# Altium footprint library STM32F103_Warship.PcbLib: 55 footprints (part 3 of 4)
Each footprint in its own frame and in the unit in brackets; x right, y up, seen from the top. Pads: shape width x height; smd on the part's side, far side on the other; paste and mask are expansions set on the pad; w line width, h text height; cw(c..) or ccw(c..) is an arc to the next point about the centre after c.
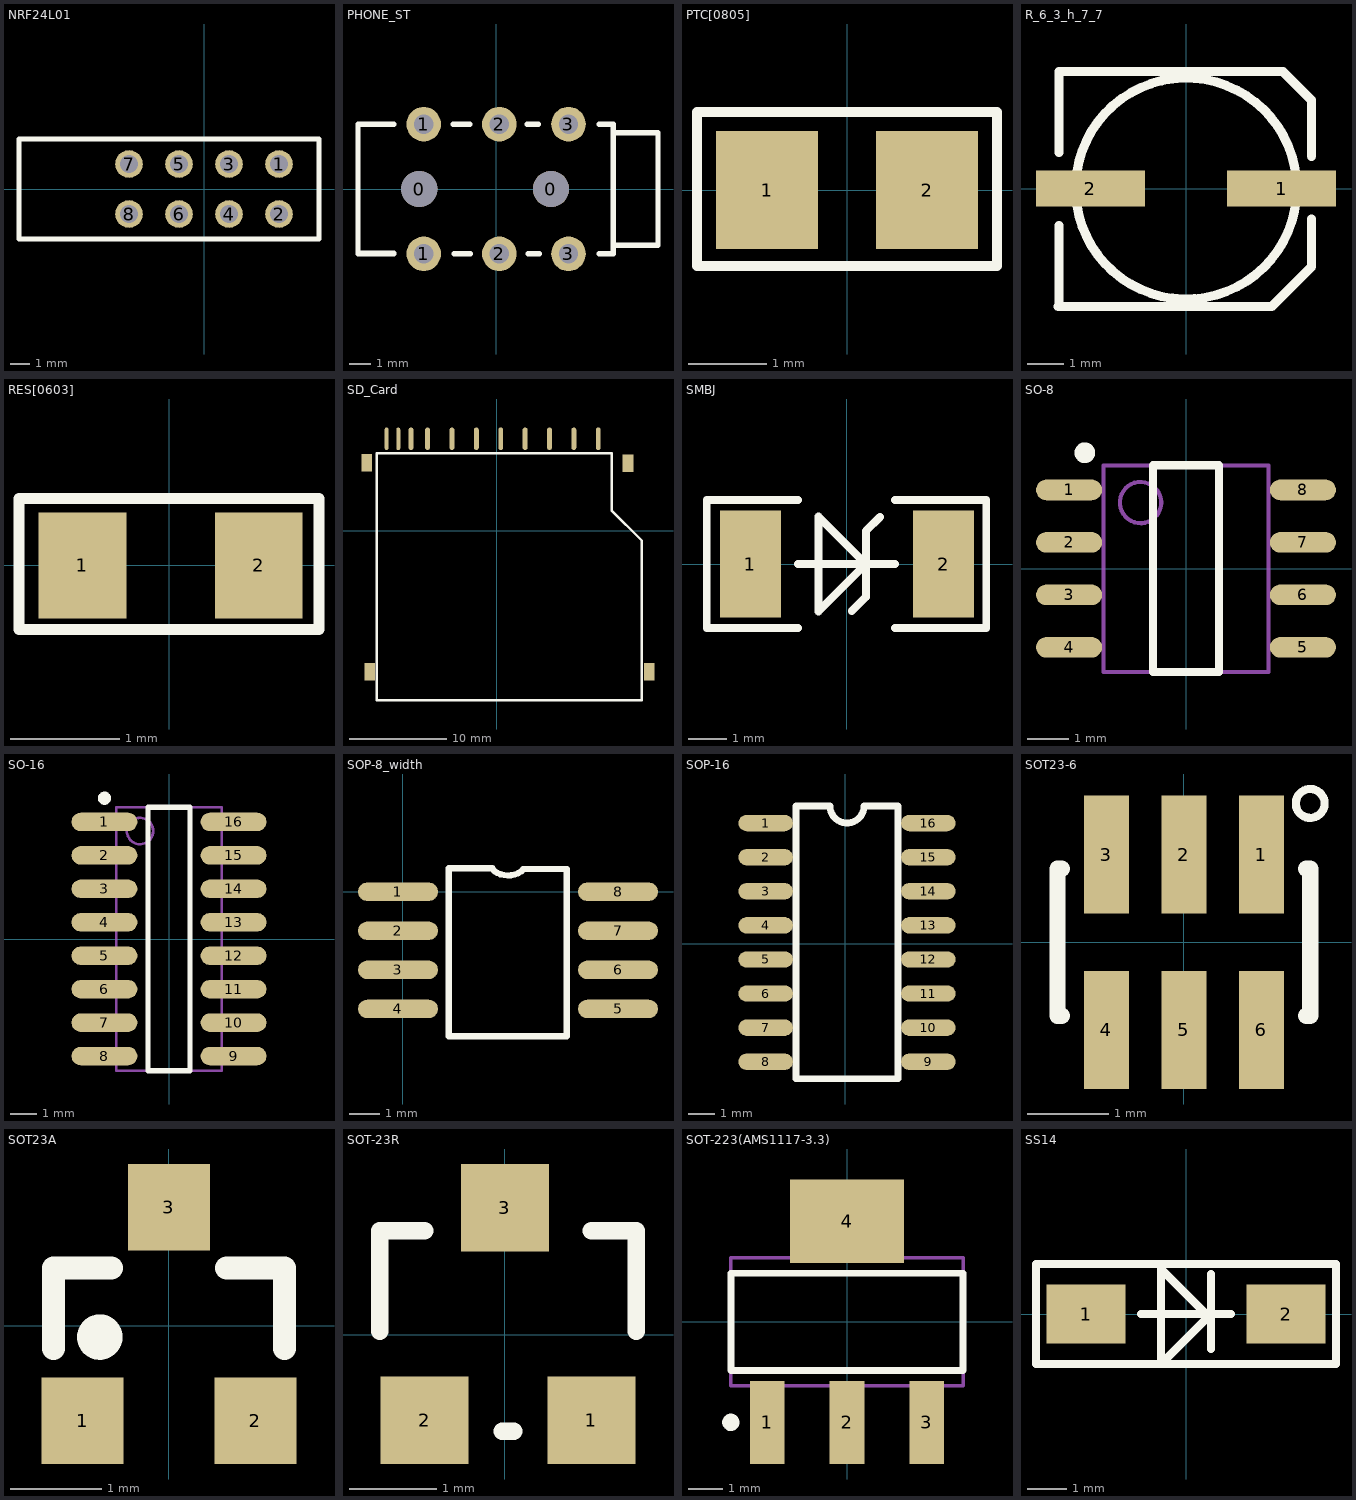
[diagram p2: the footprints below, top view; thin cyan lines are the x and y axes]

## NRF24L01 [mm]
pads (8):
  round 1.4 hole 0.9: 1(3.81,1.27) 2(3.81,-1.27) 3(1.27,1.27) 4(1.27,-1.27) 5(-1.27,1.27) 6(-1.27,-1.27) 7(-3.81,1.27) 8(-3.81,-1.27)
Top Overlay:
  lines w0.254: -9.398,-2.54 5.842,-2.54 5.842,2.54 -9.398,2.54 -9.398,-2.54
3D body "User Library-MY-NRF24L01P.STEP": height 14.8, standoff -0.11, extent -9.209,-26.514 5.791,2.486

## PHONE_ST [mm]
pads (8):
  round 1.676 hole 1.676: 0(-3.556,0) 0(2.54,0)
  round 1.6 hole 0.9: 1(-3.35,-3) 1(-3.35,3) 2(0.15,-3) 2(0.15,3) 3(3.35,-3) 3(3.35,3)
Top Overlay:
  lines w0.254: -6.393,-2.969 -4.742,-2.969 ; -4.742,-3.007 -6.393,-3.007 -6.393,3 -4.742,3 ; -1.986,3 -1.224,3 ; -1.948,-3.007 -1.186,-3.007 ; 1.443,3 1.951,3 ; 1.481,-3.007 1.989,-3.007 ; 4.783,-3.007 5.33,-3.007 ; 4.783,3 5.418,3 5.418,-3.007 ; 5.418,-2.6 7.493,-2.6 7.493,2.6 5.418,2.6
3D body "mj-2523-smt.stp": height 4.7, standoff -0.6, extent -6.375,-4 7.125,4

## PTC[0805] [mm]
pads (2):
  rect 1.3x1.5 smd: 1(-1.016,0) 2(1.016,0)
Top Overlay:
  lines w0.127: -1.905,-0.965 -1.905,0.991 1.905,0.991 1.905,-0.965 -1.905,-0.965
3D body "68917.stp": height 0.66, standoff 0, extent -1.075,-0.675 1.075,0.675

## R_6_3_h_7_7 [mm]
pads (2):
  rect 3x1 smd: 1(2.631,0) 2(-2.642,0)
Top Overlay:
  circle w0.254: c0,0 r3.051
  lines w0.254: -3.505,-1.016 -3.505,-3.251 -3.531,-3.251 2.362,-3.251 3.454,-2.159 3.454,-0.838 ; -3.505,0.991 -3.505,3.226 2.667,3.226 3.454,2.438 3.454,0.889
3D body "User Library-ALU-D8.STEP": height 7.7, standoff 0, extent -3.5,-3.3 3.5,3.3

## RES[0603] [mm]
pads (2):
  rect 0.8x0.965 smd: 1(-0.792,0) 2(0.818,0)
Top Overlay:
  lines w0.102: -1.372,-0.584 0.325,-0.584 1.367,-0.584 1.367,0.61 0.325,0.61 -1.372,0.61 -1.372,-0.584
3D body "SW3dPS-0603 SMD Resistor.STEP": height 0.3, standoff 0, extent -0.781,-0.406 0.819,0.394

## SD_Card [mm]
pads (15):
  oval 0.5x2.3 smd: 1(7.897,9.423) 2(5.397,9.423) 3(2.897,9.423) 4(0.397,9.423) 5(-2.103,9.423) 6(-4.603,9.423) 7(-7.103,9.423) 8(-8.803,9.423) 9(10.397,9.423)
  oval 0.4x2.3 smd: 10(-11.303,9.423) 11(-10.103,9.423)
  rect 1.1x1.8 smd: ""(-13.335,6.985) ""(-13.03,-14.478) ""(13.437,6.934) ""(15.621,-14.453)
Top Overlay:
  lines w0.254: -12.319,-17.399 14.859,-17.399 14.859,-1.016 11.76,2.083 11.76,7.95 -12.319,7.95 -12.319,-17.399
3D body "socket_a-sd-09-c-0-7-3.stp": height 3.3, standoff -0.85, extent -12.886,-16.947 15.147,9.409

## SMBJ [mm]
pads (2):
  rect 1.6x2.8 smd: 1(-2.515,0) 2(2.54,0)
Top Overlay:
  lines w0.203: -1.27,-1.676 -3.658,-1.676 -3.658,1.676 -1.27,1.676 ; -1.27,0 1.27,0 ; -0.737,1.245 -0.737,-1.245 0.508,0 -0.724,1.232 ; 0.14,-1.232 0.508,-0.864 0.508,0.864 0.876,1.232 ; 1.27,-1.676 3.658,-1.676 3.658,1.676 1.27,1.676
3D body "User Library-S1G.STEP": height 2.12, standoff -0.02, extent -2.527,-1.333 2.578,1.334

## SO-8 [mm]
pads (8):
  oval 1.6x0.5 smd: 1(-2.831,1.905) 2(-2.831,0.635) 3(-2.831,-0.635) 4(-2.831,-1.905) 5(2.831,-1.905) 6(2.831,-0.635) 7(2.831,0.635) 8(2.831,1.905)
Top Overlay:
  circle w0.25: c-2.45,2.805 r0.125
  lines w0.2: -0.8,-2.5 0.8,-2.5 0.8,2.5 -0.8,2.5 -0.8,-2.5
Mechanical 13:
  circle w0.1: c-1.1,1.6 r0.5
  lines w0.1: -2,-2.5 2,-2.5 2,2.5 -2,2.5 -2,-2.5
3D body "SW3DPS-SO-8 (PIC12FXXX)-DEFAULT.STEP": height 1.55, standoff -0.05, extent -2.995,-2.45 2.995,2.45

## SO-16 [mm]
pads (16):
  oval 2.5x0.7 smd: 1(-2.45,4.445) 2(-2.45,3.175) 3(-2.45,1.905) 4(-2.45,0.635) 5(-2.45,-0.635) 6(-2.45,-1.905) 7(-2.45,-3.175) 8(-2.45,-4.445) 9(2.45,-4.445) 10(2.45,-3.175) 11(2.45,-1.905) 12(2.45,-0.635) 13(2.45,0.635) 14(2.45,1.905) 15(2.45,3.175) 16(2.45,4.445)
Top Overlay:
  circle w0.25: c-2.45,5.345 r0.125
  lines w0.2: -0.8,-5 -0.8,5 0.8,5 0.8,-5 -0.8,-5
Mechanical 13:
  circle w0.1: c-1.1,4.1 r0.5
  lines w0.1: -2,-5 -2,5 2,5 2,-5 -2,-5
3D body "User Library-SOIC16-150.STEP": height 1.75, standoff 0, extent -2.9,-4.9 2.9,4.9

## SOP-8_width [mm]
pads (8):
  oval 2.6x0.6 smd: 1(-0.152,0) 2(-0.152,-1.27) 3(-0.152,-2.54) 4(-0.152,-3.81) 5(7.003,-3.81) 6(7.003,-2.54) 7(7.003,-1.27) 8(7.003,0)
Top Overlay:
  lines w0.2: 2.879,0.762 ccw(c3.425,1.283) 3.946,0.737 ; 2.921,0.762 1.5,0.762 1.5,-4.699 5.334,-4.699 5.334,0.737 ; 3.912,0.737 5.333,0.737
3D body "User Library-SOIC_N-R8.STEP": height 1.75, standoff 0, extent 0.202,-4.405 6.402,0.595

## SOP-16 [mil]
pads (16):
  oval 80x24 smd: 1(-117,177) 2(-117,127) 3(-117,77) 4(-117,27) 5(-117,-23) 6(-117,-73) 7(-117,-123) 8(-117,-173) 9(121.5,-173) 10(121.5,-123) 11(121.5,-73) 12(121.5,-23) 13(121.5,27) 14(121.5,77) 15(121.5,127) 16(121.5,177)
Top Overlay:
  lines w10: -72.75,-198 77.25,-198 77.25,202 27.25,202 cw(c2.25,202) -22.75,202 -72.75,202 -72.75,-198
3D body "User Library-SOM16_220mil (5_6mm).STEP": height 86.61, standoff 0, extent -149.01,-218.47 151.02,222.48

## SOT23-6 [mm] "SOT-23/SC-74A; 5 Leads; Body 3.1 x 3 mm, inc. leads (LxW max)"
height 1.45
pads (6):
  rect 0.55x1.45 smd: 1(0.95,1.075) 2(0,1.075) 3(-0.95,1.075) 4(-0.95,-1.075) 5(0,-1.075) 6(0.95,-1.075)
Top Overlay:
  circle w0.1: c1.549,1.702 r0.177
  lines w0.2: -1.5,-0.9 -1.55,-0.9 -1.55,0.9 -1.5,0.9 ; 1.5,-0.9 1.55,-0.9 1.55,0.9 1.5,0.9
3D body "User Library-SOT-23-6.STEP": height 1.08, standoff -0.01, extent -1.397,-1.194 1.397,1.232

## SOT23A [mm]
pads (3):
  rect 0.9x0.95 smd: 1(-0.95,-1.048) 2(0.95,-1.048) 3(0,1.302)
Top Overlay:
  circle w0.25: c-0.762,-0.127 r0.125
  lines w0.254: -1.27,-0.254 -1.27,0.635 -0.635,0.635 ; 0.635,0.635 1.27,0.635 1.27,-0.254
3D body "sot23-3.STEP": height 1, standoff -0.02, extent -1.46,-1.123 1.46,1.353

## SOT-23R [mm]
pads (3):
  rect 1x1 smd: 1(0.988,-0.975) 2(-0.917,-0.975) 3(0,1.448)
Top Overlay:
  lines w0.2: -1.425,0.041 -1.425,1.184 -0.917,1.184 ; -0.028,-1.102 0.099,-1.102 ; 0.988,1.184 1.496,1.184 1.496,0.041
3D body "SOT-23-3.STEP": height 1.2, standoff 0, extent -1.425,-1.146 1.475,1.654

## SOT-223(AMS1117-3.3) [mm]
pads (4):
  rect 1x2.4 smd: 1(-2.3,-2.9) 2(0,-2.9) 3(2.3,-2.9)
  rect 3.3x2.4 smd: 4(0,2.9)
Top Overlay:
  circle w0.25: c-3.35,-2.9 r0.125
  lines w0.2: -3.35,-1.4 3.35,-1.4 3.35,1.4 -3.35,1.4 -3.35,-1.4
Mechanical 13:
  lines w0.1: -3.35,-1.85 3.35,-1.85 3.35,1.85 -3.35,1.85 -3.35,-1.85
3D body "SOT-223_MP04A.STEP": height 1.7, standoff 0, extent -3.25,-3.48 3.25,3.48

## SS14 [mm]
pads (2):
  rect 2x1.5 smd: 1(-2.54,0) 2(2.54,0)
Top Overlay:
  lines w0.2: -1.143,0 -0.635,0 1.143,0 ; 0.635,-0.889 0.635,1.016 ; -3.81,-1.27 -3.81,1.27 3.81,1.27 3.81,-1.27 -3.81,-1.27 ; -0.635,-1.27 -0.635,1.143 0.508,0 0.508,-0.127 -0.635,-1.27
3D body: height 1.52, standoff 0, extent -2.386,-1.116 2.386,1.116